# Altium footprint library Global Library.PcbLib: 82 footprints (part 4 of 6)
Each footprint in its own frame and in the unit in brackets; x right, y up, seen from the top. Pads: shape width x height; smd on the part's side, far side on the other; paste and mask are expansions set on the pad; w line width, h text height; cw(c..) or ccw(c..) is an arc to the next point about the centre after c.
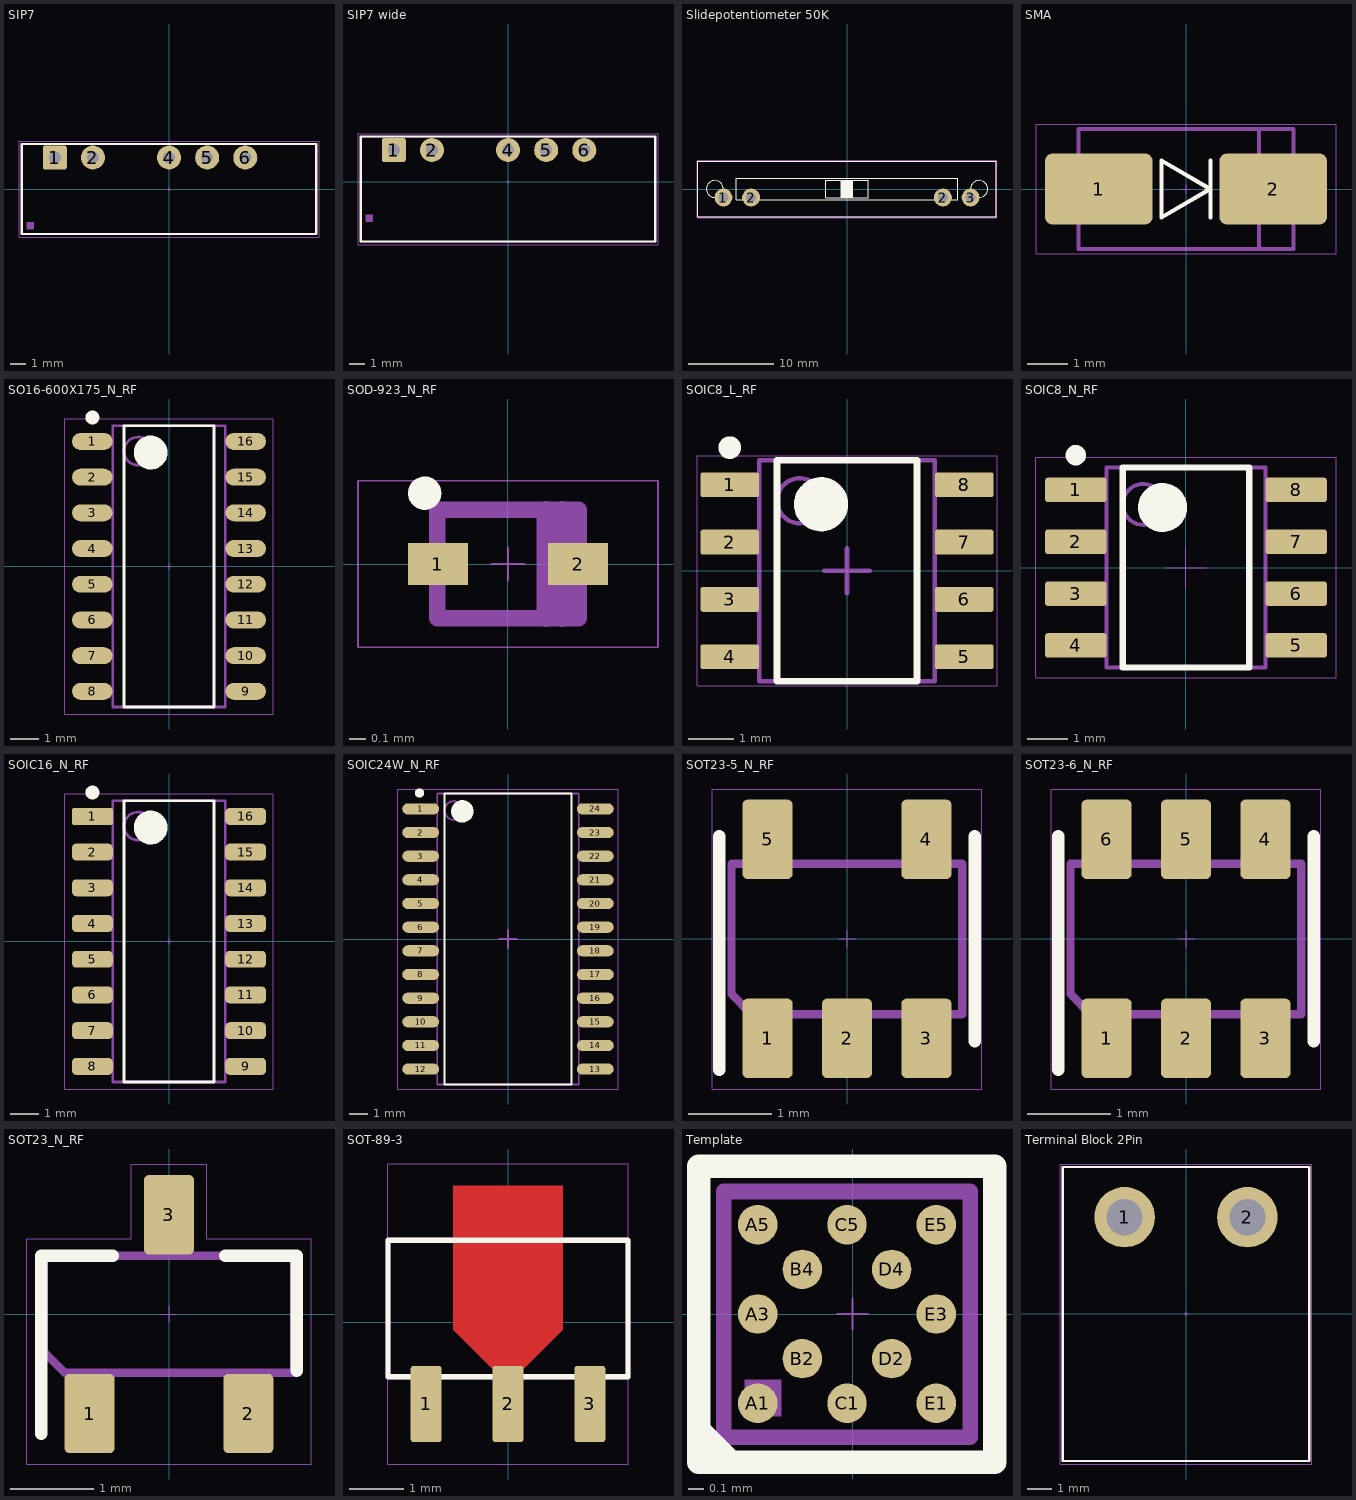
[diagram p3: the footprints below, top view; thin cyan lines are the x and y axes]

## SIP7 [mm] "7 PIN SIP Package"
height 10.16
pads (5):
  rrect20% 1.6x1.6 hole 0.8: 1(-7.615,2.1)
  round 1.6 hole 0.8: 2(-5.075,2.1) 4(0.005,2.1) 5(2.545,2.1) 6(5.085,2.1)
Top Overlay:
  lines w0.15: -9.825,-3 9.825,-3 9.825,3 -9.825,3 -9.825,-3
Top Courtyard:
  lines w0.01: -10,3.2 10,3.2 10,-3.2 -10,-3.2 -10,3.204 ; -0.1,0 0.1,0 ; 0,-0.1 0,0.1
Top Assembly:
  rectangle: -9.5,-2.7 -9,-2.2
  lines w0.1: -9.825,-3 9.825,-3 9.825,3 -9.825,3 -9.825,-3
Top Assy THT:
  rectangle: -9.5,-2.7 -9,-2.2
  lines w0.1: -9.825,-3 9.825,-3 9.825,3 -9.825,3 -9.825,-3
  text ".Designator" at -5.483,3.46 h1.52
3D body "CUI_PDME1-S5-S3-S.step": height 10.16, standoff -4.1, extent -9.825,-3 9.825,3

## SIP7 wide [mm] "7 PIN SIP Package"
height 10.16
pads (5):
  rrect20% 1.6x1.6 hole 0.8: 1(-7.615,2.1)
  round 1.6 hole 0.8: 2(-5.075,2.1) 4(0.005,2.1) 5(2.545,2.1) 6(5.085,2.1)
Top Overlay:
  lines w0.15: -9.825,-4 -9.825,3 9.825,3 9.825,-4 -9.825,-4
Top Courtyard:
  lines w0.01: -10,3.2 10,3.2 10,-4.2 -10,-4.2 -10,3.204 ; -0.1,0 0.1,0 ; 0,-0.1 0,0.1
Top Assembly:
  rectangle: -9.5,-2.7 -9,-2.2
  lines w0.1: -9.825,-4 -9.825,3 9.825,3 9.825,-4 -9.825,-4
Top Assy THT:
  rectangle: -9.5,-2.7 -9,-2.2
  lines w0.1: -9.825,-4 -9.825,3 9.825,3 9.825,-4 -9.825,-4
  text ".Designator" at -5.483,3.46 h1.52
3D body "CUI_PDME1-S5-S3-S.step": height 10.16, standoff -4.1, extent -9.825,-3 9.825,3

## Slidepotentiometer 50K [mm]
pads (4):
  round 2.1 hole 1.2: 1(-14.5,-1) 2(-11.25,-1) 2(11.25,-1) 3(14.5,-1)
Top Overlay:
  circle w0.1: c15.5,0 r1
  circle w0.1: c-15.5,0 r1
  rectangle: -0.7,-1 0.7,1
  lines w0.1: -0.7,-1 -0.7,1 ; 0.7,-1 0.7,1 ; -17.5,-3.25 -17.5,3.25 17.5,3.25 17.5,-3.25 -17.5,-3.25 ; -13,-1.25 -13,1.25 13,1.25 13,-1.25 -13,-1.25 ; -2.5,-1 2.5,-1 2.5,1 -2.5,1 -2.5,-1
Top Courtyard:
  lines w0.01: -0.1,0 0.1,0 ; 0,-0.1 0,0.1 ; -17.6,-3.4 -17.6,3.4 17.6,3.4 17.6,-3.4 -17.6,-3.4
Top Assembly:
  lines w0.1: -17.5,-3.25 -17.5,3.25 17.5,3.25 17.5,-3.25 -17.5,-3.25
Top Assy SMT:
  lines w0.1: -17.5,-3.25 17.5,-3.25 17.5,3.25 -17.5,3.25 -17.5,-3.25
Top Assy THT:
  text ".Designator" at -17.335,3.575 h1
3D body "Slidepotentiometer B50K.stp": height 19.38, standoff -4, extent -17.5,-3.25 17.5,3.25

## SMA [mm] "Diode Package"
pads (2):
  rrect20% 2.65x1.75 smd: 1(-2.15,0) 2(2.15,0)
Top Overlay:
  lines w0.1: 0.6,-0.7 0.6,0.7 ; -0.6,-0.7 -0.6,0.7 0.6,0 -0.6,-0.7
Top Courtyard:
  lines w0.01: -0.1,0 0.1,0 ; 0,-0.1 0,0.1 ; -3.7,-1.6 3.7,-1.6 3.7,1.6 -3.7,1.6 -3.7,-1.6
Top Assembly:
  lines w0.1: 1.8,-1.475 1.8,1.475 ; -2.65,-1.475 2.65,-1.475 2.65,1.475 -2.65,1.475 -2.65,-1.475
Top Assy SMT:
  lines w0.1: 1.8,-1.475 1.8,1.475 ; -2.65,-1.475 2.65,-1.475 2.65,1.475 -2.65,1.475 -2.65,-1.475
  text ".Designator" at -2.675,1.725 h1
3D body "Diode SMA.stp": height 2.41, standoff 0, extent -2.64,-1.46 2.64,1.46

## SO16-600X175_N_RF [mm] "SOIC, 16-Leads, Body 9.90x3.90mm, Pitch 1.27mm, IPC Medium Density"
height 1.75
pads (16):
  oval 1.45x0.6 smd: 1(-2.725,4.445) 2(-2.725,3.175) 3(-2.725,1.905) 4(-2.725,0.635) 5(-2.725,-0.635) 6(-2.725,-1.905) 7(-2.725,-3.175) 8(-2.725,-4.445) 9(2.725,-4.445) 10(2.725,-3.175) 11(2.725,-1.905) 12(2.725,-0.635) 13(2.725,0.635) 14(2.725,1.905) 15(2.725,3.175) 16(2.725,4.445)
Top Overlay:
  circle w0.6: c-0.65,4.05 r0.3
  circle w0.25: c-2.725,5.295 r0.125
  lines w0.1: -1.6,-5 1.6,-5 1.6,5 -1.6,5 -1.6,-5
Top Courtyard:
  lines w0.01: -0.1,0 0.1,0 ; 0,-0.1 0,0.1 ; -3.7,-5.25 3.7,-5.25 3.7,5.25 -3.7,5.25 -3.7,-5.25
Top Assembly:
  circle w0.1: c-1.1,4.1 r0.5
  lines w0.1: -2,-5 2,-5 2,5 -2,5 -2,-5
Top Assy SMT:
  circle w0.1: c-1.1,4.1 r0.5
  lines w0.1: -2,-5 2,-5 2,5 -2,5 -2,-5
  text ".Designator" at -2,5.3 h1
3D body "SO16-600X175_N_RF.step": height 1.75, standoff 0, extent -3,-5 3,5

## SOD-923_N_RF [mm] "SODFL, 2-Leads, Body 0.60x1.00mm, IPC Medium Density"
height 0.4
pads (2):
  rect 0.36x0.25 smd: 1(-0.42,0) 2(0.42,0)
Top Overlay:
  circle w0.1: c-0.5,0.425 r0.05
Top Courtyard:
  lines w0.01: -0.1,0 0.1,0 ; 0,-0.1 0,0.1 ; -0.9,-0.5 0.9,-0.5 0.9,0.5 -0.9,0.5 -0.9,-0.5
Top Assembly:
  lines w0.1: -0.425,-0.325 0.425,-0.325 0.425,0.325 -0.425,0.325 -0.425,-0.325
  lines w0.105: 0.225,-0.325 0.225,0.325 ; 0.325,-0.325 0.325,0.325
Top Assy SMT:
  lines w0.1: -0.425,-0.325 -0.425,0.325 0.425,0.325 0.425,-0.325 -0.425,-0.325
  lines w0.105: 0.225,-0.325 0.225,0.325 ; 0.325,-0.325 0.325,0.325
  text ".Designator" at -1,0.6 h0.8
3D body "SOD-923_N_RF2.step": height 0.4, standoff 0, extent -0.5,-0.325 0.5,0.325

## SOIC8_L_RF [mm] "SOIC, 8-Leads, Body 4.90x3.90mm, Pitch 1.27mm, IPC High Density"
height 1.75
pads (8):
  rrect20% 1.3x0.55 smd: 1(-2.6,1.905) 2(-2.6,0.635) 3(-2.6,-0.635) 4(-2.6,-1.905) 5(2.6,-1.905) 6(2.6,-0.635) 7(2.6,0.635) 8(2.6,1.905)
Top Overlay:
  circle w0.25: c-2.6,2.73 r0.125
  circle w0.6: c-0.575,1.475 r0.3
  lines w0.15: -1.55,-2.45 -1.55,2.45 1.55,2.45 1.55,-2.45 -1.55,-2.45
Top Courtyard:
  lines w0.01: -3.325,-2.55 -3.325,2.55 3.325,2.55 3.325,-2.55 -3.325,-2.55
  lines w0.1: -0.5,0 0.5,0 ; 0,-0.5 0,0.5
Top Assembly:
  circle w0.1: c-1.05,1.55 r0.5
  lines w0.1: -1.95,-2.45 -1.95,2.45 1.95,2.45 1.95,-2.45 -1.95,-2.45
Top Assy SMT:
  circle w0.1: c-1.05,1.55 r0.5
  lines w0.1: -1.95,-2.45 1.95,-2.45 1.95,2.45 -1.95,2.45 -1.95,-2.45
  text ".Designator" at -2.177,3.038 h1
3D body "SOIC8_L_RF.step": height 1.75, standoff 0, extent -3,-2.45 3,2.45

## SOIC8_N_RF [mm] "SOIC, 8-Leads, Body 4.90x3.90mm, Pitch 1.27mm, IPC Medium Density"
height 1.75
pads (8):
  rrect20% 1.5x0.6 smd: 1(-2.7,1.905) 2(-2.7,0.635) 3(-2.7,-0.635) 4(-2.7,-1.905) 5(2.7,-1.905) 6(2.7,-0.635) 7(2.7,0.635) 8(2.7,1.905)
Top Overlay:
  circle w0.6: c-0.575,1.475 r0.3
  circle w0.25: c-2.7,2.755 r0.125
  lines w0.15: -1.55,-2.45 1.55,-2.45 1.55,2.45 -1.55,2.45 -1.55,-2.45
Top Courtyard:
  lines w0.01: -0.5,0 0.5,0 ; 0,-0.5 0,0.5 ; -3.675,-2.7 3.675,-2.7 3.675,2.7 -3.675,2.7 -3.675,-2.7
Top Assembly:
  circle w0.1: c-1.05,1.55 r0.5
  lines w0.1: -1.95,-2.45 1.95,-2.45 1.95,2.45 -1.95,2.45 -1.95,-2.45
Top Assy SMT:
  circle w0.1: c-1.05,1.55 r0.5
  lines w0.1: -1.95,-2.45 1.95,-2.45 1.95,2.45 -1.95,2.45 -1.95,-2.45
  text ".Designator" at -2.177,3.038 h1
3D body "SOIC8_N_RF.step": height 1.75, standoff 0, extent -3,-2.45 3,2.45

## SOIC16_N_RF [mm] "SOIC, 16-Leads, Body 9.90x3.90mm, Pitch 1.27mm, IPC Medium Density"
height 1.75
pads (16):
  rrect20% 1.45x0.6 smd: 1(-2.725,4.445)
  rrect50% 1.45x0.6 smd: 2(-2.725,3.175) 3(-2.725,1.905) 4(-2.725,0.635) 5(-2.725,-0.635) 6(-2.725,-1.905) 7(-2.725,-3.175) 8(-2.725,-4.445) 9(2.725,-4.445) 10(2.725,-3.175) 11(2.725,-1.905) 12(2.725,-0.635) 13(2.725,0.635) 14(2.725,1.905) 15(2.725,3.175) 16(2.725,4.445)
Top Overlay:
  circle w0.25: c-2.725,5.295 r0.125
  circle w0.6: c-0.65,4.05 r0.3
  lines w0.1: -1.6,-5 -1.6,5 1.6,5 1.6,-5 -1.6,-5
Top Courtyard:
  lines w0.01: -0.1,0 0.1,0 ; 0,-0.1 0,0.1 ; -3.7,-5.25 -3.7,5.25 3.7,5.25 3.7,-5.25 -3.7,-5.25
Top Assembly:
  circle w0.1: c-1.1,4.1 r0.5
  lines w0.1: -2,-5 -2,5 2,5 2,-5 -2,-5
3D body "SOIC16_N_RF.step": height 1.75, standoff 0, extent -3,-5 3,5

## SOIC24W_N_RF [mm] "SOIC, 24-Leads, Body 15.40x7.50mm, Pitch 1.27mm, IPC Medium Density"
height 2.65
pads (24):
  oval 1.981x0.6 smd: 1(-4.687,6.985) 2(-4.687,5.715) 3(-4.687,4.445) 4(-4.687,3.175) 5(-4.687,1.905) 6(-4.687,0.635) 7(-4.687,-0.635) 8(-4.687,-1.905) 9(-4.687,-3.175) 10(-4.687,-4.445) 11(-4.687,-5.715) 12(-4.687,-6.985) 13(4.687,-6.985) 14(4.687,-5.715) 15(4.687,-4.445) 16(4.687,-3.175) 17(4.687,-1.905) 18(4.687,-0.635) 19(4.687,0.635) 20(4.687,1.905) 21(4.687,3.175) 22(4.687,4.445) 23(4.687,5.715) 24(4.687,6.985)
Top Overlay:
  circle w0.25: c-4.75,7.835 r0.125
  circle w0.6: c-2.45,6.85 r0.3
  lines w0.1: -3.4,-7.8 -3.4,7.8 3.4,7.8 3.4,-7.8 -3.4,-7.8
Top Courtyard:
  lines w0.01: -5.925,-8.05 -5.925,8.05 5.925,8.05 5.925,-8.05 -5.925,-8.05
  lines w0.1: -0.5,0 0.5,0 ; 0,-0.5 0,0.5
Top Assembly:
  circle w0.1: c-2.9,6.9 r0.5
  lines w0.1: -3.8,-7.8 -3.8,7.8 3.8,7.8 3.8,-7.8 -3.8,-7.8
3D body "SOIC24W_N_RF.step": height 2.65, standoff 0, extent -5.162,-7.8 5.162,7.8

## SOT23-5_N_RF [mm] "SOT23, 5-Leads, Body 2.90x2.70mm, Pitch 0.95mm, IPC Medium Density"
height 1.45
pads (5):
  rrect20% 0.6x0.95 smd: 1(-0.95,-1.19) 2(0,-1.19) 3(0.95,-1.19) 4(0.95,1.19) 5(-0.95,1.19)
Top Overlay:
  lines w0.15: -1.53,-1.568 -1.53,1.225 ; 1.527,-1.225 1.527,1.225
Top Courtyard:
  lines w0.01: -0.1,0 0.1,0 ; 0,-0.1 0,0.1 ; -1.611,-1.797 -1.611,1.793 1.611,1.793 1.611,-1.797 -1.611,-1.797
Top Assembly:
  lines w0.025: -1.155,-0.889 -1.155,-1.3 -0.755,-1.3 -0.755,-0.889 ; -1.153,0.889 -1.153,1.3 -0.753,1.3 -0.753,0.889 ; -0.205,-0.889 -0.205,-1.3 0.195,-1.3 0.195,-0.889 ; 0.745,-0.889 0.745,-1.225 1.145,-1.225 1.145,-0.889 ; 0.747,0.889 0.747,1.3 1.147,1.3 1.147,0.889
  lines w0.1: -1.383,-0.661 -1.383,0.898 1.381,0.898 1.381,-0.902 -1.141,-0.902 -1.383,-0.661
Top Assy SMT:
  lines w0.025: -1.155,-0.889 -1.155,-1.3 -0.755,-1.3 -0.755,-0.889 ; -1.153,0.889 -1.153,1.3 -0.753,1.3 -0.753,0.889 ; -0.205,-0.889 -0.205,-1.3 0.195,-1.3 0.195,-0.889 ; 0.745,-0.889 0.745,-1.225 1.145,-1.225 1.145,-0.889 ; 0.747,0.889 0.747,1.3 1.147,1.3 1.147,0.889
  lines w0.1: -1.383,-0.661 -1.141,-0.902 1.381,-0.902 1.381,0.898 -1.383,0.898 -1.383,-0.661
  text ".Designator" at -0.533,-0.296 h1
3D body "SOT95P248X115-6L.step": height 1.15, standoff 0, extent -1.55,-1.3 1.55,1.3

## SOT23-6_N_RF [mm] "SOT23, 6-Leads, Body 2.90x2.70mm, Pitch 0.95mm, IPC Medium Density"
height 1.45
pads (6):
  rrect20% 0.6x0.95 smd: 1(-0.95,-1.19) 2(0,-1.19) 3(0.95,-1.19) 4(0.95,1.19) 5(0,1.19) 6(-0.95,1.19)
Top Overlay:
  lines w0.15: -1.53,-1.568 -1.53,1.225 ; 1.527,-1.225 1.527,1.225
Top Courtyard:
  lines w0.01: -0.1,0 0.1,0 ; 0,-0.1 0,0.1 ; -1.611,-1.797 -1.611,1.793 1.611,1.793 1.611,-1.797 -1.611,-1.797
Top Assembly:
  lines w0.025: -1.155,-0.889 -1.155,-1.3 -0.755,-1.3 -0.755,-0.889 ; -1.153,0.889 -1.153,1.3 -0.753,1.3 -0.753,0.889 ; -0.205,-0.889 -0.205,-1.3 0.195,-1.3 0.195,-0.889 ; -0.203,0.889 -0.203,1.3 0.197,1.3 0.197,0.889 ; 0.745,-0.889 0.745,-1.225 1.145,-1.225 1.145,-0.889 ; 0.747,0.889 0.747,1.3 1.147,1.3 1.147,0.889
  lines w0.1: -1.383,-0.661 -1.383,0.898 1.381,0.898 1.381,-0.902 -1.141,-0.902 -1.383,-0.661
Top Assy SMT:
  lines w0.025: -1.155,-0.889 -1.155,-1.3 -0.755,-1.3 -0.755,-0.889 ; -1.153,0.889 -1.153,1.3 -0.753,1.3 -0.753,0.889 ; -0.205,-0.889 -0.205,-1.3 0.195,-1.3 0.195,-0.889 ; -0.203,0.889 -0.203,1.3 0.197,1.3 0.197,0.889 ; 0.745,-0.889 0.745,-1.225 1.145,-1.225 1.145,-0.889 ; 0.747,0.889 0.747,1.3 1.147,1.3 1.147,0.889
  lines w0.1: -1.383,-0.661 -1.141,-0.902 1.381,-0.902 1.381,0.898 -1.383,0.898 -1.383,-0.661
  text ".Designator" at -0.533,-0.296 h1
3D body "SOT95P248X115-6L.step": height 1.15, standoff 0, extent -1.55,-1.3 1.55,1.3

## SOT23_N_RF [mm] "SOT23, 3-Leads, Body 2.9x1.3mm, Pitch 0.95mm, Lead Span 2.4mm, IPC Medium Density"
height 1.15
pads (3):
  rrect20% 0.6x0.95 smd: 1(-0.95,-1.19) 2(0.95,-1.19) 3(0,1.19)
Top Overlay:
  lines w0.15: -1.53,-1.43 -1.53,0.7 -0.674,0.7 ; 0.674,0.7 1.53,0.7 1.53,-0.68
Top Courtyard:
  lines w0.01: -0.1,0 0.1,0 ; 0,-0.1 0,0.1 ; -1.7,-1.794 1.7,-1.794 1.7,0.9 0.45,0.9 0.45,1.797 -0.45,1.797 -0.45,0.9 -1.7,0.9 -1.7,-1.794
Top Assembly:
  lines w0.025: -1.15,-0.71 -1.15,-1.32 -0.75,-1.32 -0.75,-0.71 ; -0.2,0.71 -0.2,1.32 0.2,1.32 0.2,0.71 ; 0.75,-0.71 0.75,-1.32 1.15,-1.32 1.15,-0.71
  lines w0.1: -1.5,-0.45 -1.5,0.7 1.5,0.7 1.5,-0.7 -1.25,-0.7 -1.5,-0.45
Top Assy SMT:
  lines w0.025: -1.15,-0.71 -1.15,-1.32 -0.75,-1.32 -0.75,-0.71 ; -0.2,0.71 -0.2,1.32 0.2,1.32 0.2,0.71 ; 0.75,-0.71 0.75,-1.32 1.15,-1.32 1.15,-0.71
  lines w0.1: -1.5,-0.45 -1.25,-0.7 1.5,-0.7 1.5,0.7 -1.5,0.7 -1.5,-0.45
  text ".Designator" at -1.41,-0.25 h1
3D body "SOT95P248X115-3L.step": height 1.15, standoff 0, extent -1.55,-1.3 1.55,1.3

## SOT-89-3 [mm]
pads (3):
  rrect20% 0.57x1.4 smd: 1(-1.5,-1.5) 2(0,-1.5) 3(1.5,-1.5)
Top Layer:
  region: -0.285,-0.857 -1,-0.142 -1,2.5 1,2.5 1,-0.142 0.285,-0.857
Top Overlay:
  lines w0.1: -2.2,-1 -2.2,1.5 2.2,1.5 2.2,-1 -2.2,-1
Top Courtyard:
  lines w0.01: -0.1,0 0.1,0 ; 0,-0.1 0,0.1 ; -2.2,-2.6 -2.2,2.9 2.2,2.9 2.2,-2.6 -2.2,-2.6
Top Assembly:
  lines w0.1: -2.2,-1 -2.2,1.5 2.2,1.5 2.2,-1 -2.2,-1
Top Assy SMT:
  lines w0.1: -2.2,-1 2.2,-1 2.2,1.5 -2.2,1.5 -2.2,-1
3D body "CircuitWorks-SOT-89.step": height 1.6, standoff 0.1, extent -2.25,-2.05 2.25,1.95

## Template [mm] "BGA Special BMM150"
height 0.4
pads (12):
  round 0.25 smd: A1(-0.601,-0.566) A3(-0.601,0) A5(-0.601,0.566) B2(-0.318,-0.283) B4(-0.318,0.283) C1(-0.035,-0.566) C5(-0.035,0.566) D2(0.248,-0.283) D4(0.248,0.283) E1(0.531,-0.566) E3(0.531,0) E5(0.531,0.566)
Top Overlay:
  lines w0.15: -0.96,-0.75 -0.773,-0.938 ; -0.975,-0.94 -0.975,0.935 0.9,0.935 0.9,-0.94 -0.975,-0.94
Top Courtyard:
  lines w0.01: -0.1,0 0.1,0 ; 0,-0.1 0,0.1 ; -0.985,-0.95 -0.985,0.95 0.915,0.95 0.915,-0.95 -0.985,-0.95
Top Assembly:
  lines w0.1: -0.815,-0.78 0.745,-0.78 0.745,0.775 -0.815,0.775 -0.815,-0.78
Top Assy SMT:
  rectangle: -0.685,-0.65 -0.451,-0.416
  lines w0.1: -0.815,-0.78 0.745,-0.78 0.745,0.775 -0.815,0.775 -0.815,-0.78
  text ".Designator" at -1.135,1.175 h1
3D body "BGA12_P056_0015x0015_Free.step": height 0.6, standoff 0, extent -0.795,-0.795 0.795,0.795

## Terminal Block 2Pin [mm]
pads (2):
  round 2.5 hole 1.5: 1(-2.54,4) 2(2.54,4)
Top Overlay:
  lines w0.1: -5.1,-6.075 -5.1,6.075 5.1,6.075 5.1,-6.075 -5.1,-6.075
Top Courtyard:
  lines w0.01: -0.1,0 0.1,0 ; 0,-0.1 0,0.1 ; -5.2,-6.2 5.2,-6.2 5.2,6.2 -5.2,6.2 -5.2,-6.2
Top Assembly:
  lines w0.1: -5.1,-6.075 -5.1,6.075 5.1,6.075 5.1,-6.075 -5.1,-6.075
Top Assy THT:
  lines w0.1: -5.1,-6.075 5.1,-6.075 5.1,6.075 -5.1,6.075 -5.1,-6.075
  text ".Designator" at -5.5,-6 h1
3D body "691312510002 (rev1).stp": height 8.45, standoff -3.55, extent -5.08,-6 5.08,6